# Altium footprint library Radolovic_PCB_Library.PcbLib: 29 footprints (part 2 of 2)
Each footprint in its own frame and in the unit in brackets; x right, y up, seen from the top. Pads: shape width x height; smd on the part's side, far side on the other; paste and mask are expansions set on the pad; w line width, h text height; cw(c..) or ccw(c..) is an arc to the next point about the centre after c.
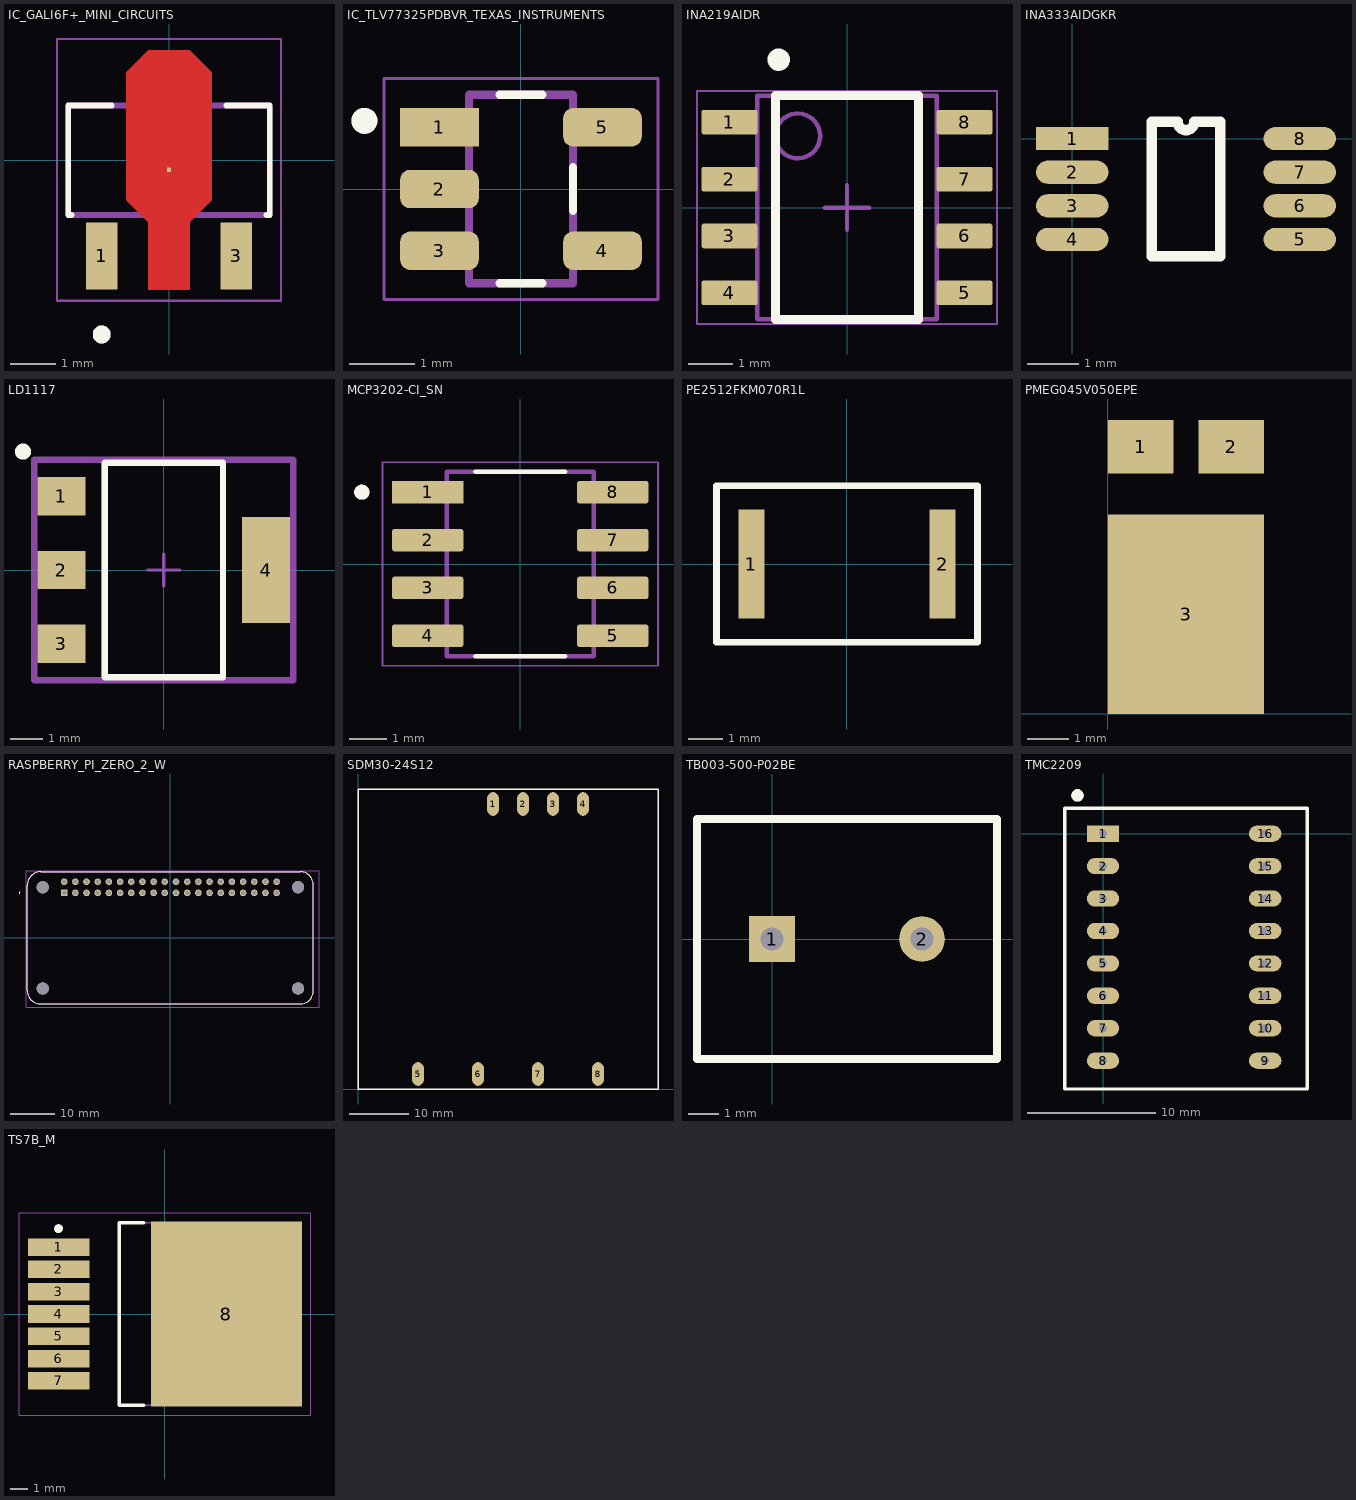
[diagram p1: the footprints below, top view; thin cyan lines are the x and y axes]

## IC_GALI6F+_MINI_CIRCUITS [mil] "RF Amplifier ML AMPL / SURF MT / RoHS"
pads (4):
  rect 28x59 smd: 1(-59,-84) 3(59,-84)
  round 1 smd: 2(0,-8.5)
  rect 3.94x3.94 smd paste-39.37 mask+0: 2_4(0,-8.5)
Top Layer:
  region: 37.5,77 37.5,-35 18,-54.5 18,-113.5 -18,-113.5 -18,-54.5 -37.5,-35 -37.5,77 -18,96.5 18,96.5
Top Overlay:
  circle w7.87: c-59,-152.87 r3.94
  lines w5: -85.6,-48 -88.5,-48 -88.5,48 -50.12,48 ; 50.12,48 88.5,48 88.5,-48 85.6,-48
Top Paste:
  region: 37.5,77 37.5,-35 18,-54.5 18,-113.5 -18,-113.5 -18,-54.5 -37.5,-35 -37.5,77 -18,96.5 18,96.5
Top Solder:
  region: 41.44,78.97 41.44,-36.97 21.94,-56.47 21.94,-117.44 -21.94,-117.44 -21.94,-56.47 -41.44,-36.97 -41.44,78.97 -19.97,100.44 19.97,100.44
Mechanical 13:
  circle w7.87: c-59,-152.87 r3.94
  lines w5: -88.5,-48 -88.5,48 88.5,48 88.5,-48 -88.5,-48
Mechanical 15:
  lines w1.97: -98.34,-123.35 98.34,-123.35 98.34,106.34 -98.34,106.34 -98.34,-123.35
3D body "step_temp.STEP": height 62.99, standoff 0, extent -88.58,-97.34 88.58,63.88

## IC_TLV77325PDBVR_TEXAS_INSTRUMENTS [mm] "LDO Voltage Regulators 300-mA high-PSRR low -IQ low-dropout regulator"
pads (5):
  rect 1.21x0.59 smd: 1(-1.255,0.95)
  rrect50% 1.21x0.59 smd: 2(-1.255,0) 3(-1.255,-0.95) 4(1.255,-0.95) 5(1.255,0.95)
Top Overlay:
  circle w0.2: c-2.41,1.05 r0.1
  lines w0.127: -0.33,-1.45 0.33,-1.45 ; -0.33,1.45 0.33,1.45 ; 0.8,-0.335 0.8,0.335
Mechanical 13:
  circle w0.2: c-2.41,1.05 r0.1
  lines w0.127: -0.8,-1.45 0.8,-1.45 0.8,1.45 -0.8,1.45 -0.8,-1.45
Mechanical 15:
  lines w0.05: -2.11,-1.7 -2.11,1.7 2.11,1.7 2.11,-1.7 -2.11,-1.7
3D body "INA180A3IDBVR--3DModel-STEP-1.step": height 1.46, standoff 0.01, extent -1.425,-1.45 1.375,1.45

## INA219AIDR [mm] "SOIC, 8-Leads, Body 5x4mm, Pitch 1.27mm, IPC High Density"
height 1.75
pads (8):
  rrect18% 1.25x0.55 smd: 1(-2.625,1.905) 2(-2.625,0.635) 3(-2.625,-0.635) 4(-2.625,-1.905) 5(2.625,-1.905) 6(2.625,-0.635) 7(2.625,0.635) 8(2.625,1.905)
Top Overlay:
  circle w0.25: c-1.524,3.302 r0.125
  lines w0.2: -1.6,-2.5 1.6,-2.5 1.6,2.5 -1.6,2.5 -1.6,-2.5
Mechanical 1:
  text ".Designator" at -1.397,-0.254 h0.6
Mechanical 13:
  circle w0.1: c-1.1,1.6 r0.5
  lines w0.1: -2,-2.5 2,-2.5 2,2.5 -2,2.5 -2,-2.5
Mechanical 15:
  lines w0.05: -3.35,-2.6 3.35,-2.6 3.35,2.6 -3.35,2.6 -3.35,-2.6
  lines w0.1: -0.5,0 0.5,0 ; 0,-0.5 0,0.5
3D body "SOIC-8akaD0008AakaM08A.stp": height 1.63, standoff 0, extent -3,-2.45 3,2.45

## INA333AIDGKR [mm] "INA333AIDGKR / TSSOP-8"
pads (8):
  rect 1.4x0.45 smd: 1(0,0)
  oval 1.4x0.45 smd: 2(0,-0.65) 3(0,-1.3) 4(0,-1.95) 5(4.4,-1.95) 6(4.4,-1.3) 7(4.4,-0.65) 8(4.4,0)
Top Overlay:
  lines w0.2: 1.535,-2.275 1.535,0.325 2.037,0.325 ccw(c2.2,0.325) 2.362,0.325 2.865,0.325 2.865,-2.275 1.535,-2.275
3D body "INA333--3DModel-STEP-56544.STEP": height 1.1, standoff 0, extent -0.25,-2.475 4.65,0.525

## LD1117 [mm]
pads (4):
  rect 1.5x1.2 smd paste+0: 1(-3.2,2.3) 2(-3.2,0) 3(-3.2,-2.3)
  rect 1.5x3.3 smd paste+0: 4(3.2,0)
Top Overlay:
  circle w0.25: c-4.4,3.7 r0.125
  lines w0.2: -1.85,-3.35 1.85,-3.35 1.85,3.35 -1.85,3.35 -1.85,-3.35
Top 3D Body:
  lines w0.2: -1.85,-3.35 1.85,-3.35 1.85,3.35 -1.85,3.35 -1.85,-3.35
Top Courtyard:
  lines w0.2: -4.05,-3.45 4.05,-3.45 4.05,3.45 -4.05,3.45 -4.05,-3.45
Top Assembly:
  lines w0.2: -4.05,-3.45 4.05,-3.45 4.05,3.45 -4.05,3.45 -4.05,-3.45
  text ".Designator" at 0,0.187 h1
Top Component Center:
  lines w0.1: -0.5,0 0.5,0 ; 0,-0.5 0,0.5
3D body "IC_STMicroelectronics_LDL1117S50R_eec.STEP": height 0.25, standoff 0, extent -4.05,-3.45 4.05,3.45

## MCP3202-CI_SN [mm] "MCP3202-CI_SN / SOIC-8"
pads (8):
  rect 1.9x0.6 smd: 1(-2.455,1.905)
  rrect25% 1.9x0.6 smd: 2(-2.455,0.635) 3(-2.455,-0.635) 4(-2.455,-1.905) 5(2.455,-1.905) 6(2.455,-0.635) 7(2.455,0.635) 8(2.455,1.905)
Top Overlay:
  circle w0.2: c-4.205,1.905 r0.1
  lines w0.127: -1.185,-2.45 1.185,-2.45 ; -1.185,2.45 1.185,2.45
Mechanical 13:
  circle w0.2: c-4.205,1.905 r0.1
  lines w0.127: -1.95,-2.45 1.95,-2.45 1.95,2.45 -1.95,2.45 -1.95,-2.45
Mechanical 15:
  lines w0.05: -3.655,-2.7 -3.655,2.7 3.655,2.7 3.655,-2.7 -3.655,-2.7
3D body "step_temp.STEP": height 1.75, standoff 0, extent -3,-2.45 3,2.45

## PE2512FKM070R1L [mm]
pads (2):
  rect 0.76x3.18 smd: 1(-2.795,0) 2(2.795,0)
Top Overlay:
  lines w0.2: -3.81,-2.286 3.81,-2.286 3.81,2.286 -3.81,2.286 -3.81,0 -3.81,-2.286

## PMEG045V050EPE [mm]
pads (3):
  rect 1.6x1.3 smd: 1(0.8,6.5) 2(3,6.5)
  rect 3.8x4.85 smd: 3(1.9,2.425)

## RASPBERRY_PI_ZERO_2_W [mm]
pads (44):
  rect 1.508x1.508 / inner round 1.508 / far side rect 1.508x1.508 hole 1: 1(-24.13,10.23)
  round 1.508 hole 1: 2(-24.13,12.77) 3(-21.59,10.23) 4(-21.59,12.77) 5(-19.05,10.23) 6(-19.05,12.77) 7(-16.51,10.23) 8(-16.51,12.77) 9(-13.97,10.23) 10(-13.97,12.77) 11(-11.43,10.23) 12(-11.43,12.77) 13(-8.89,10.23) 14(-8.89,12.77) 15(-6.35,10.23) 16(-6.35,12.77) 17(-3.81,10.23) 18(-3.81,12.77) 19(-1.27,10.23) 20(-1.27,12.77) 21(1.27,10.23) 22(1.27,12.77) 23(3.81,10.23) 24(3.81,12.77) 25(6.35,10.23) 26(6.35,12.77) 27(8.89,10.23) 28(8.89,12.77) 29(11.43,10.23) 30(11.43,12.77) 31(13.97,10.23) 32(13.97,12.77) 33(16.51,10.23) 34(16.51,12.77) 35(19.05,10.23) 36(19.05,12.77) 37(21.59,10.23) 38(21.59,12.77) 39(24.13,10.23) 40(24.13,12.77)
  round 2.75 hole 2.75 unplated: ""(-29,-11.5) ""(-29,11.5) ""(29,-11.5) ""(29,11.5)
Top Overlay:
  circle w0.2: c-34.29,10.23 r0.1
  lines w0.127: 4.4,-15 12.75,-15 ; 17,-15 25.35,-15 ; -32.5,-12 ccw(c-29.5,-12) -29.5,-15 29.5,-15 ccw(c29.5,-12) 32.5,-12 32.5,12 ccw(c29.5,12) 29.5,15 -29.5,15 ccw(c-29.5,12) -32.5,12 -32.5,-12
Mechanical 13:
  circle w0.2: c-34.29,10.23 r0.1
  lines w0.127: 4.4,-15 12.75,-15 ; 17,-15 25.35,-15 ; -32.5,-12 ccw(c-29.5,-12) -29.5,-15 29.5,-15 ccw(c29.5,-12) 32.5,-12 32.5,12 ccw(c29.5,12) 29.5,15 -29.5,15 ccw(c-29.5,12) -32.5,12 -32.5,-12
Mechanical 15:
  lines w0.05: -32.75,-15.75 -32.75,15.25 33.75,15.25 33.75,-15.75 -32.75,-15.75
3D body "step_temp.STEP": height 4.57, standoff -1.04, extent -32.5,-16 33.5,15

## SDM30-24S12 [mm] "SDM30-24S12"
pads (8):
  oval 2x4 hole 0.4: 1(22.86,48.26) 2(27.94,48.26) 3(33.02,48.26) 4(38.1,48.26) 5(10.16,2.54) 6(20.32,2.54) 7(30.48,2.54) 8(40.64,2.54)
Top Overlay:
  lines w0.254: 0,0 0,50.8 50.8,50.8 50.8,0 0,0

## TB003-500-P02BE [mil]
pads (2):
  rect 60x60 hole 30: 1(0,0)
  round 60 hole 30: 2(196.85,0)
Top Overlay:
  lines w10: -98.43,-157.48 -98.43,157.48 295.28,157.48 295.28,-157.48 -98.43,-157.48

## TMC2209 [mm]
pads (17):
  rect 2.54x1.27 hole 0.635: 1(0,0)
  oval 2.54x1.27 hole 0.635: 2(0,-2.54) 3(0,-5.08) 4(0,-7.62) 5(0,-10.16) 6(0,-12.7) 7(0,-15.24) 8(0,-17.78) 9(12.7,-17.78) 10(12.7,-15.24) 11(12.7,-12.7) 12(12.7,-10.16) 13(12.7,-7.62) 14(12.7,-5.08) 15(12.7,-2.54) 16(12.7,0)
  round 1 on Top Overlay: ""(-2,3)
Top Overlay:
  lines w0.254: -3,-20 16,-20 16,2 -3,2 -3,-20

## TS7B_M [mm] "D2-PAK, 8-Leads, Body 8.6x10.2mm, Pitch 1.27mm, Lead Span 14.1mm, IPC Low Density"
height 4.64
pads (8):
  rect 3.5x1 smd: 1(-6.05,3.81) 2(-6.05,2.54) 3(-6.05,1.27) 4(-6.05,0) 5(-6.05,-1.27) 6(-6.05,-2.54) 7(-6.05,-3.81)
  rect 8.6x10.55 smd: 8(3.5,0)
Top Overlay:
  circle w0.25: c-6.05,4.86 r0.125
  lines w0.2: -1.2,-5.2 -2.6,-5.2 -2.6,5.2 -1.2,5.2
Mechanical 13:
  lines w0.1: -2.6,-5.2 6.29,-5.2 6.29,5.2 -2.6,5.2 -2.6,-5.2
Mechanical 15:
  lines w0.05: -8.3,-5.775 8.3,-5.775 8.3,5.775 -8.3,5.775 -8.3,-5.775
  lines w0.1: -0.5,0 0.5,0 ; 0,-0.5 0,0.5
3D body: height 4.64, standoff 0, extent -2.6,-5.2 6.29,5.2